# Altium footprint library custom.PcbLib: 330 footprints (part 21 of 21)
Each footprint in its own frame and in the unit in brackets; x right, y up, seen from the top. Pads: shape width x height; smd on the part's side, far side on the other; paste and mask are expansions set on the pad; w line width, h text height; cw(c..) or ccw(c..) is an arc to the next point about the centre after c.
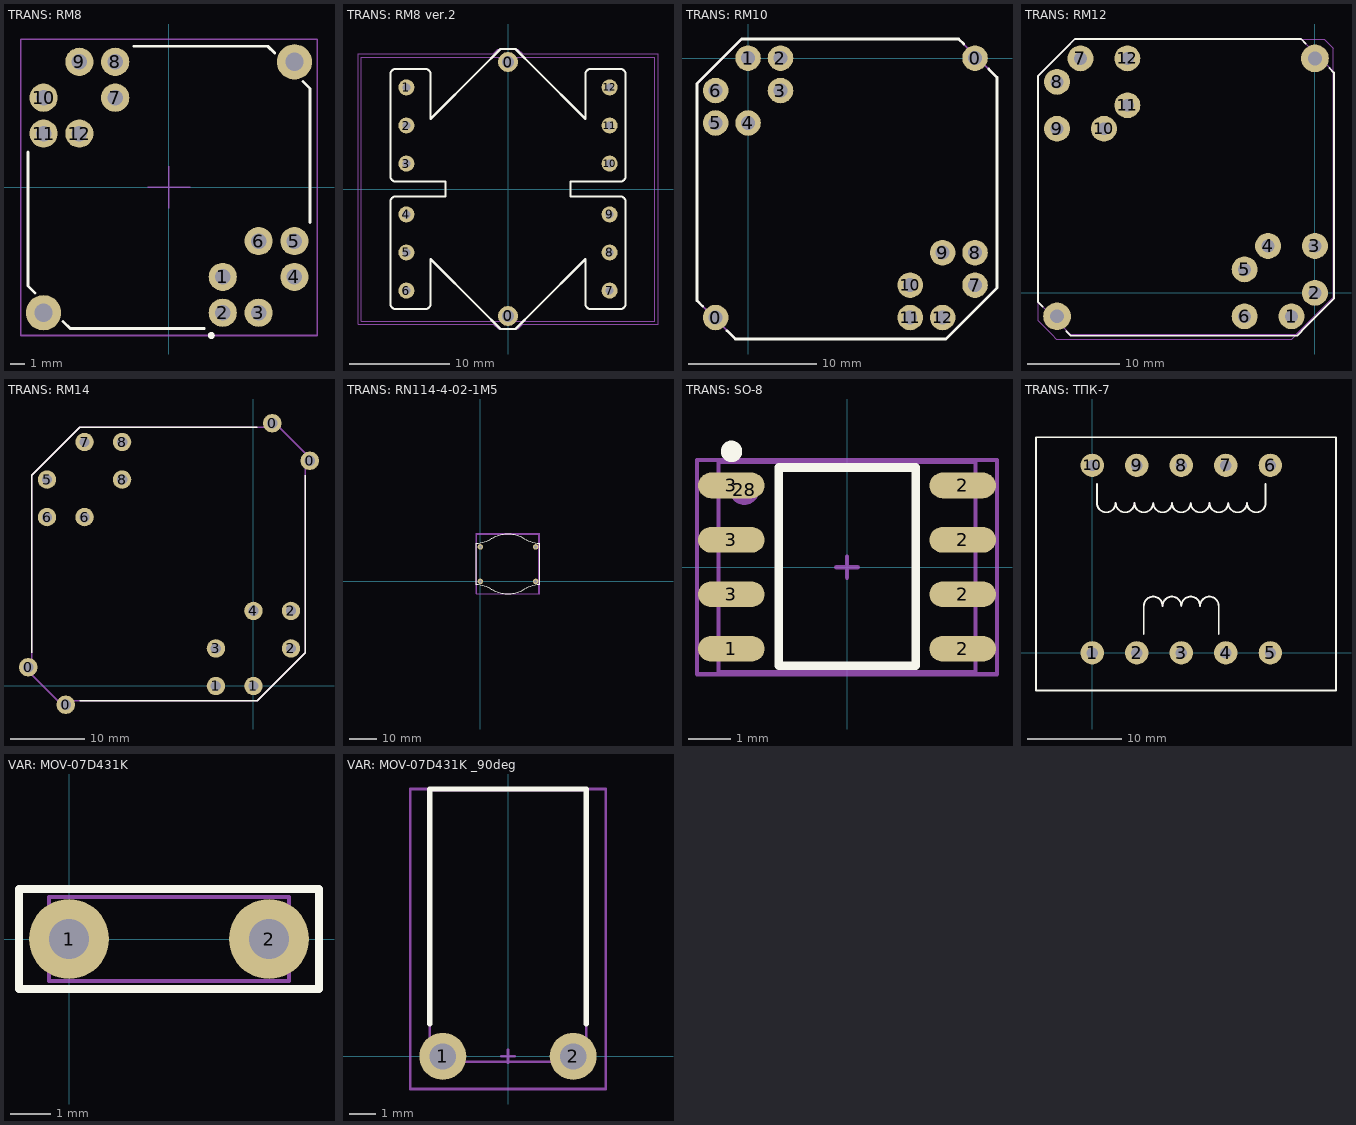
[diagram p20: the footprints below, top view; thin cyan lines are the x and y axes]

## TRANS: RM8 [mm]
pads (15):
  round 2 hole 1.1: 1(3.81,-6.35) 2(3.81,-8.89) 3(6.35,-8.89) 4(8.89,-6.35) 5(8.89,-3.81) 6(6.35,-3.81) 7(-3.81,6.35) 8(-3.81,8.89) 9(-6.35,8.89) 10(-8.89,6.35) 11(-8.89,3.81) 12(-6.35,3.81)
  round 2.5 hole 1.3: ""(-8.89,-8.89) ""(8.89,8.89)
  round 0.5 on Top Overlay: ""(3,-10.5)
Top Overlay:
  lines w0.2: -10,2.5 -10,-7 ; -9.5,-7.5 -10,-7 ; -7.5,-9.5 -7,-10 ; -2.5,10 7,10 ; 2.5,-10 -7,-10 ; 7.5,9.5 7,10 ; 9.5,7.5 10,7 ; 10,-2.5 10,7 ; -10,-7 -10,-7 ; -7,-10 -7,-10 ; 7,10 7,10 ; 10,7 10,7
Top Assy:
  lines w0.1: -10.51,-10.51 10.511,-10.51 10.511,10.51 -10.51,10.51 -10.51,-10.51
Size Area:
  lines w0.1: -1.5,0 1.5,0 ; 0,-1.5 0,1.5 ; -10.5,-10.5 10.5,-10.5 10.5,10.5 -10.5,10.5 -10.5,-10.5
3D body "User Library-RM8.STEP": height 16.45, standoff -3.37, extent -10.51,-10.51 10.511,10.51

## TRANS: RM8 ver.2 [mm]
pads (14):
  round 2 hole 1.2: 0(0,-12.7) 0(0,12.7)
  round 1.6 hole 0.8: 1(-10.16,10.16) 2(-10.16,6.35) 3(-10.16,2.54) 4(-10.16,-2.54) 5(-10.16,-6.35) 6(-10.16,-10.16) 7(10.16,-10.16) 8(10.16,-6.35) 9(10.16,-2.54) 10(10.16,2.54) 11(10.16,6.35) 12(10.16,10.16)
Top Overlay:
  lines w0.2: -11.75,-11.5 ccw(c-11.25,-11.5) -11.25,-12 -8.25,-12 ccw(c-8.25,-11.5) -7.75,-11.5 -7.75,-7 -2.71,-12.04 -0.75,-14 0,-14 0.75,-14 2.71,-12.04 7.75,-7 7.75,-11.5 ccw(c8.25,-11.5) 8.25,-12 11.25,-12 ccw(c11.25,-11.5) 11.75,-11.5 11.75,-1.25 ccw(c11.25,-1.25) 11.25,-0.75 6.25,-0.75 6.25,0.75 11.25,0.75 ccw(c11.25,1.25) 11.75,1.25 11.75,11.5 ccw(c11.25,11.5) 11.25,12 8.25,12 ccw(c8.25,11.5) 7.75,11.5 7.75,7 2.71,12.04 0.75,14 0,14 -0.75,14 -2.71,12.04 -7.75,7 -7.75,11.5 ccw(c-8.25,11.5) -8.25,12 -11.25,12 ccw(c-11.25,11.5) -11.75,11.5 -11.75,1.25 ccw(c-11.25,1.25) -11.25,0.75 -6.25,0.75 -6.25,-0.75 -11.25,-0.75 ccw(c-11.25,-1.25) -11.75,-1.25 -11.75,-11.5
Top Assy:
  lines w0.1: -14.7,-13.215 -14.7,13.196 14.7,13.196 14.7,-13.215 -14.7,-13.215
Size Area:
  lines w0.1: -15,-13.5 -1.5,-13.5 -1,-14 0.25,-14 1,-14 1.5,-13.5 15,-13.5 15,13.5 1.5,13.5 1,14 -0.5,14 -1,14 -1.5,13.5 -15,13.5 -15,-13.5
3D body "User Library-RM8 transformer.STEP": height 16.5, standoff -4.45, extent -14.7,-13.215 14.7,13.196

## TRANS: RM10 [mm]
height 19
pads (14):
  round 2 hole 1.1: 0(-2.54,-20.32) 0(17.78,0) 1(0,0) 2(2.54,0) 3(2.54,-2.54) 4(0,-5.08) 5(-2.54,-5.08) 6(-2.54,-2.54) 7(17.78,-17.78) 8(17.78,-15.24) 9(15.24,-15.24) 10(12.7,-17.78) 11(12.7,-20.32) 12(15.24,-20.32)
Top Overlay:
  lines w0.2: -3.55,-19.45 -4,-19 ; -1.65,-21.35 -1,-22 ; 16.9,1.1 16.5,1.5 16.28,1.5 -0.5,1.5 -4,-2 -4,-19 ; 18.85,-0.85 19.5,-1.5 19.5,-1.72 19.5,-18 15.5,-22 ; -4,-19 -4,-19 ; -1,-22 -1,-22 ; -1,-22 15.5,-22 ; 15.5,-22 15.5,-22
Top Assy:
  lines w0.1: -4,-19 -1,-22 15.5,-22 19.5,-18 19.5,-1.5 16.5,1.5 -0.5,1.5 -4,-2 -4,-19
Size Area:
  lines w0.1: -4,-19 -1,-22 15.5,-22 19.5,-18 19.5,-1.5 16.5,1.5 -0.5,1.5 -4,-2 -4,-19
3D body "RM10.STEP": height 19.27, standoff -3.22, extent -13.142,-31.019 28.511,10.635

## TRANS: RM12 [mm]
pads (14):
  round 2.8 hole 1.4: 1(-2.54,-2.54) 2(0,0) 3(0,5.08) 4(-5.08,5.08) 5(-7.62,2.54) 6(-7.62,-2.54) 7(-25.4,25.4) 8(-27.94,22.86) 9(-27.94,17.78) 10(-22.86,17.78) 11(-20.32,20.32) 12(-20.32,25.4)
  round 3 hole 1.5: ""(-27.94,-2.54) ""(0,25.4)
Top Overlay:
  lines w0.2: -29.5,-1.5 -30,-1 ; -26.94,-4.14 -26.44,-4.64 -1.94,-4.64 -0.94,-3.64 2.06,-0.64 2.06,23.86 ; -1,27 -1.5,27.5 -26,27.5 -27,26.5 -30,23.5 -30,-1 ; 1.56,24.36 2.06,23.86 ; -30,-1 -30,-1 ; 2.06,23.86 2.06,23.86
Top Assy:
  lines w0.1: -30,-1 -26.5,-4.5 -2,-4.5 2,-0.5 2,24 -1.5,27.5 -26,27.5 -30,23.5 -30,-1
Size Area:
  lines w0.1: -30,-3 -30,20.5 -30,23.5 -27.5,26 -26,27.5 1,27.5 1.5,27 2,26.5 2,6 2,-0.5 -2.5,-5 -28,-5 -28.5,-4.5 -30,-3
3D body "User Library-RM12-1.STEP": height 24.65, standoff -3.95, extent -41.68,-16.28 13.681,39.081

## TRANS: RM14 [mm]
pads (16):
  round 2.5 hole 1.4: 0(-30.48,2.54) 0(-25.4,-2.54) 0(2.54,35.56) 0(7.62,30.48) 1(-5.08,0) 1(0,0) 2(5.08,5.08) 2(5.08,10.16) 3(-5.08,5.08) 4(0,10.16) 5(-27.94,27.94) 6(-27.94,22.86) 6(-22.86,22.86) 7(-22.86,33.02) 8(-17.78,27.94) 8(-17.78,33.02)
Top Overlay:
  lines w0.2: -30,4.5 -30,28.5 -23.5,35 0.5,35 ; -23.5,-2 0.5,-2 7,4.5 7,28.5
Top Assy:
  lines w0.2: -30,1.5 -26.5,-2 0.5,-2 7,4.5 7,31.5 3.5,35 -21,35 -23.5,35 -30,28.5 -30,1.5
Size Area:
  lines w0.1: -30,1.5 -30,28.5 -23.5,35 3.5,35 7,31.5 7,4.5 0.5,-2 -26.5,-2 -30,1.5
3D body "STEP-WE-PFC-RM14-rev1.stp": height 30.1, standoff -4, extent -43.036,-15.036 20.036,48.036

## TRANS: RN114-4-02-1M5 [mm]
pads (4):
  round 2 hole 1.1: 1(0,0) 2(20.1,0) 3(0,12.5) 4(20.1,12.5)
Top Overlay:
  lines w0.2: -1.5,-1.18 -1.5,13.8 ; -1.498,-1.18 cw(c-4.911,-24.516) 3.485,-2.476 ccw(c10,7) 16.595,-2.421 cw(c24.991,-24.461) 21.502,-1.136 ; -1.498,13.8 ccw(c-4.911,37.137) 3.485,15.097 cw(c10,5.62) 16.595,15.042 ccw(c24.991,37.081) 21.502,13.756 ; 21.5,-1.124 21.5,13.756
Top Assy:
  lines w0.1: -1.25,-4.45 21.25,-4.45 21.25,17.05 -1.25,17.05 -1.25,-4.45
Size Area:
  lines w0.1: -1.5,-4.5 21.5,-4.5 21.5,17.5 -1.5,17.5 -1.5,-4.5
3D body "User Library-RN114.STEP": height 13.2, standoff -3.99, extent -1.25,-4.45 21.25,17.05

## TRANS: SO-8 [mm]
pads (9):
  rrect100% 1.55x0.6 smd: 1(-2.7,-1.905) 2(2.7,-1.905) 2(2.7,-0.635) 2(2.7,0.635) 2(2.7,1.905) 3(-2.7,-0.635) 3(-2.7,0.635) 3(-2.7,1.905)
  round 0.7 on Mech1: 28(-2.395,1.8)
Top Overlay:
  circle w0.25: c-2.695,2.7 r0.125
  lines w0.2: -1.595,-2.3 1.605,-2.3 1.605,2.325 -1.595,2.325 -1.595,-2.3
Top Assy:
  lines w0.1: -3,-2.45 -3,2.45 3,2.45 3,-2.45 -3,-2.45
Size Area:
  lines w0.1: -0.25,0 0.25,0 ; 0,-0.25 0,0.25 ; -3.5,-2.5 -3.5,2.5 3.5,2.5 3.5,-2.5 -3.5,-2.5
3D body "User Library-SOIC-8-1.STEP": height 1.75, standoff 0, extent -3,-2.45 3,2.45

## TRANS: ТПК-7 [mm]
pads (10):
  round 2.5 hole 1.2: 1(0,0) 2(4.75,0) 3(9.5,0) 4(14.25,0) 5(19,0) 6(19,20) 7(14.25,20) 8(9.5,20) 9(4.75,20) 10(0,20)
Top Overlay:
  lines w0.2: 0.5,18 0.5,16 ccw(c1.5,16) 2.5,16 ccw(c3.5,16) 4.5,16 ccw(c5.5,16) 6.5,16 ccw(c7.5,16) 8.5,16 ccw(c9.5,16) 10.5,16 ccw(c11.5,16) 12.5,16 ccw(c13.5,16) 14.5,16 ccw(c15.5,16) 16.5,16 ccw(c17.5,16) 18.5,16 18.5,18 ; 5.5,2 5.5,5 cw(c6.5,5) 7.5,5 cw(c8.5,5) 9.5,5 cw(c10.5,5) 11.5,5 cw(c12.5,5) 13.5,5 13.5,2 ; -6,-4 -6,23 26,23 26,-4 -6,-4
Top Assy:
  lines w0.1: 0.5,18 0.5,16 ccw(c1.5,16) 2.5,16 ccw(c3.5,16) 4.5,16 ccw(c5.5,16) 6.5,16 ccw(c7.5,16) 8.5,16 ccw(c9.5,16) 10.5,16 ccw(c11.5,16) 12.5,16 ccw(c13.5,16) 14.5,16 ccw(c15.5,16) 16.5,16 ccw(c17.5,16) 18.5,16 18.5,18 ; 5.5,2 5.5,5 cw(c6.5,5) 7.5,5 cw(c8.5,5) 9.5,5 cw(c10.5,5) 11.5,5 cw(c12.5,5) 13.5,5 13.5,2 ; 26,23 26,-4 -5.96,-4 -6,-4.04 -6,23 26,23 ; 26,23 26,23
3D body "ТПК-0.7.SLDPRT": height 21, standoff -3, extent -6,-4.04 26,23

## VAR: MOV-07D431K [mm]
pads (2):
  round 2 hole 1: 1(0,0) 2(5,0)
Top Overlay:
  lines w0.2: -1.25,-1.25 6.25,-1.25 6.25,1.25 -1.25,1.25 -1.25,-1.25
Top Assy:
  lines w0.1: -0.5,-1.05 5.5,-1.05 5.5,1.05 -0.5,1.05 -0.5,-1.05
Size Area:
  lines w0.1: -1.25,-1.25 -1.25,1.25 6.25,1.25 6.25,-1.25 -1.25,-1.25
3D body "User Library-Disc_CAP d6x3_5_5mm.STEP": height 8.1, standoff -2.02, extent -0.5,-1.05 5.5,1.05

## VAR: MOV-07D431K _90deg [mm]
pads (3):
  round 1.8 hole 1: 1(-2.5,0) 2(2.5,0)
  round 0.5 on Mech1: ""(-2.5,0.25)
Top Overlay:
  lines w0.2: -3,1.25 -3,10.25 3,10.25 3,1.25
Top Assy:
  lines w0.1: -3,-0.2 3,-0.2 3,10.2 -3,10.2 -3,-0.2
Size Area:
  lines w0.1: -0.25,0 0.25,0 ; 0,-0.25 0,0.25 ; -3.75,-1.25 3.75,-1.25 3.75,10.25 -3.75,10.25 -3.75,-1.25
3D body "DEBB33D_90.STEP": height 4.02, standoff -1.98, extent -3,-0.2 3,10.2